# Altium footprint library adafruit.PCBLIB: 643 footprints (part 41 of 41)
Each footprint in its own frame and in the unit in brackets; x right, y up, seen from the top. Pads: shape width x height; smd on the part's side, far side on the other; paste and mask are expansions set on the pad; w line width, h text height; cw(c..) or ccw(c..) is an arc to the next point about the centre after c.
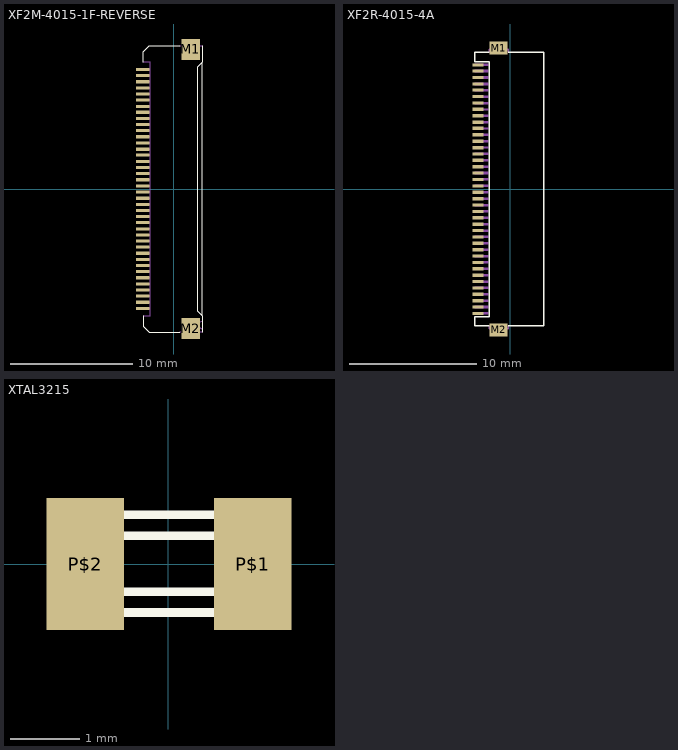
[diagram p40: the footprints below, top view; thin cyan lines are the x and y axes]

## XF2M-4015-1F-REVERSE [mil]
pads (42):
  rect 44x10 smd: 1(-100,384) 2(-100,365) 3(-100,345) 4(-100,325) 5(-100,306) 6(-100,286) 7(-100,266) 8(-100,247) 9(-100,227) 10(-100,207) 11(-100,188) 12(-100,168) 13(-100,148) 14(-100,128) 15(-100,109) 16(-100,89) 17(-100,69) 18(-100,50) 19(-100,30) 20(-100,10) 21(-100,-9.84) 22(-100,-29.53) 23(-100,-49.21) 24(-100,-68.9) 25(-100,-88.58) 26(-100,-108.27) 27(-100,-127.95) 28(-100,-147.64) 29(-100,-167.32) 30(-100,-187.01) 31(-100,-206.69) 32(-100,-226.38) 33(-100,-246.06) 34(-100,-265.75) 35(-100,-285.43) 36(-100,-305.12) 37(-100,-324.8) 38(-100,-344.49) 39(-100,-364.17) 40(-100,-383.86)
  rect 60x67 smd: M1(54,449) M2(54,-448.82)
Top Overlay:
  lines w4: -98.03,-407.48 -98.03,-440.94 -78.35,-460.63 19,-460.63 ; -98.03,408 -98.03,441 -78.35,461 19,461 ; 91,-460.63 91,-407.48 ; 91,461 91,408 ; 91,-407.48 76,-391.73 76,392 91,408 ; 91,-407.48 91,408
Mechanical 16:
  region: -77.36,-380.91 -111.81,-380.91 -111.81,-386.81 -77.36,-386.81
  region: -77.36,-361.22 -111.81,-361.22 -111.81,-367.13 -77.36,-367.13
  region: -77.36,-341.54 -111.81,-341.54 -111.81,-347.44 -77.36,-347.44
  region: -77.36,-321.85 -111.81,-321.85 -111.81,-327.76 -77.36,-327.76
  region: -77.36,-302.17 -111.81,-302.17 -111.81,-308.07 -77.36,-308.07
  region: -77.36,-282.48 -111.81,-282.48 -111.81,-288.39 -77.36,-288.39
  region: -77.36,-262.8 -111.81,-262.8 -111.81,-268.7 -77.36,-268.7
  region: -77.36,-243.11 -111.81,-243.11 -111.81,-249.02 -77.36,-249.02
  region: -77.36,-223.43 -111.81,-223.43 -111.81,-229.33 -77.36,-229.33
  region: -77.36,-203.74 -111.81,-203.74 -111.81,-209.65 -77.36,-209.65
  region: -77.36,-184.06 -111.81,-184.06 -111.81,-189.96 -77.36,-189.96
  region: -77.36,-164.37 -111.81,-164.37 -111.81,-170.28 -77.36,-170.28
  region: -77.36,-144.69 -111.81,-144.69 -111.81,-150.59 -77.36,-150.59
  region: -77.36,-125 -111.81,-125 -111.81,-130.91 -77.36,-130.91
  region: -77.36,-105.31 -111.81,-105.31 -111.81,-111.22 -77.36,-111.22
  region: -77.36,-85.63 -111.81,-85.63 -111.81,-91.54 -77.36,-91.54
  region: -77.36,-65.94 -111.81,-65.94 -111.81,-71.85 -77.36,-71.85
  region: -77.36,-46.26 -111.81,-46.26 -111.81,-52.17 -77.36,-52.17
  region: -77.36,-26.57 -111.81,-26.57 -111.81,-32.48 -77.36,-32.48
  region: -77.36,-6.89 -111.81,-6.89 -111.81,-12.8 -77.36,-12.8
  region: -77.36,13 -111.81,13 -111.81,7 -77.36,7
  region: -77.36,33 -111.81,33 -111.81,27 -77.36,27
  region: -77.36,53 -111.81,53 -111.81,47 -77.36,47
  region: -77.36,72 -111.81,72 -111.81,66 -77.36,66
  region: -77.36,92 -111.81,92 -111.81,86 -77.36,86
  region: -77.36,112 -111.81,112 -111.81,106 -77.36,106
  region: -77.36,131 -111.81,131 -111.81,125 -77.36,125
  region: -77.36,151 -111.81,151 -111.81,145 -77.36,145
  region: -77.36,171 -111.81,171 -111.81,165 -77.36,165
  region: -77.36,190 -111.81,190 -111.81,185 -77.36,185
  region: -77.36,210 -111.81,210 -111.81,204 -77.36,204
  region: -77.36,230 -111.81,230 -111.81,224 -77.36,224
  region: -77.36,250 -111.81,250 -111.81,244 -77.36,244
  region: -77.36,269 -111.81,269 -111.81,263 -77.36,263
  region: -77.36,289 -111.81,289 -111.81,283 -77.36,283
  region: -77.36,309 -111.81,309 -111.81,303 -77.36,303
  region: -77.36,328 -111.81,328 -111.81,322 -77.36,322
  region: -77.36,348 -111.81,348 -111.81,342 -77.36,342
  region: -77.36,368 -111.81,368 -111.81,362 -77.36,362
  region: -77.36,387 -111.81,387 -111.81,381 -77.36,381
  lines w4: -98.03,-407.48 -75.39,-407.48 -75.39,408 -98.03,408 ; 19,-460.63 36,-460.63 36,-472.44 76,-472.44 76,-460.63 91,-460.63 ; 19,461 36,461 36,473 76,473 76,461 91,461 ; 91,-450.79 68,-437.01 91,-423.23

## XF2R-4015-4A [mil]
pads (42):
  rect 34x10 smd: 1(-100,384) 2(-100,365) 3(-100,345) 4(-100,325) 5(-100,306) 6(-100,286) 7(-100,266) 8(-100,247) 9(-100,227) 10(-100,207) 11(-100,188) 12(-100,168) 13(-100,148) 14(-100,128) 15(-100,109) 16(-100,89) 17(-100,69) 18(-100,50) 19(-100,30) 20(-100,10) 21(-100,-9.84) 22(-100,-29.53) 23(-100,-49.21) 24(-100,-68.9) 25(-100,-88.58) 26(-100,-108.27) 27(-100,-127.95) 28(-100,-147.64) 29(-100,-167.32) 30(-100,-187.01) 31(-100,-206.69) 32(-100,-226.38) 33(-100,-246.06) 34(-100,-265.75) 35(-100,-285.43) 36(-100,-305.12) 37(-100,-324.8) 38(-100,-344.49) 39(-100,-364.17) 40(-100,-383.86)
  rect 56x40 smd: M1(-36.02,436) M2(-36.02,-435.04)
Top Overlay:
  lines w4: -65.55,-422.24 -108.86,-422.24 -108.86,-393.7 -65.55,-393.7 -65.55,394 -108.86,394 -108.86,423 -65.55,423 ; -6.5,-422.24 104,-422.24 104,423 -6.5,423
Top Solder:
  rectangle: -117.72,378 -82.28,390
  rectangle: -117.72,359 -82.28,371
  rectangle: -117.72,339 -82.28,351
  rectangle: -117.72,319 -82.28,331
  rectangle: -117.72,300 -82.28,312
  rectangle: -117.72,280 -82.28,292
  rectangle: -117.72,260 -82.28,272
  rectangle: -117.72,241 -82.28,252
  rectangle: -117.72,221 -82.28,233
  rectangle: -117.72,201 -82.28,213
  rectangle: -117.72,182 -82.28,193
  rectangle: -117.72,162 -82.28,174
  rectangle: -117.72,142 -82.28,154
  rectangle: -117.72,123 -82.28,134
  rectangle: -117.72,103 -82.28,115
  rectangle: -117.72,83 -82.28,95
  rectangle: -117.72,63 -82.28,75
  rectangle: -117.72,44 -82.28,56
  rectangle: -117.72,24 -82.28,36
  rectangle: -117.72,4 -82.28,16
  rectangle: -117.72,-15.75 -82.28,-3.94
  rectangle: -117.72,-35.43 -82.28,-23.62
  rectangle: -117.72,-55.12 -82.28,-43.31
  rectangle: -117.72,-74.8 -82.28,-62.99
  rectangle: -117.72,-94.49 -82.28,-82.68
  rectangle: -117.72,-114.17 -82.28,-102.36
  rectangle: -117.72,-133.86 -82.28,-122.05
  rectangle: -117.72,-153.54 -82.28,-141.73
  rectangle: -117.72,-173.23 -82.28,-161.42
  rectangle: -117.72,-192.91 -82.28,-181.1
  rectangle: -117.72,-212.6 -82.28,-200.79
  rectangle: -117.72,-232.28 -82.28,-220.47
  rectangle: -117.72,-251.97 -82.28,-240.16
  rectangle: -117.72,-271.65 -82.28,-259.84
  rectangle: -117.72,-291.34 -82.28,-279.53
  rectangle: -117.72,-311.02 -82.28,-299.21
  rectangle: -117.72,-330.71 -82.28,-318.9
  rectangle: -117.72,-350.39 -82.28,-338.58
  rectangle: -117.72,-370.08 -82.28,-358.27
  rectangle: -117.72,-389.76 -82.28,-377.95
Mechanical 16:
  rectangle: -110.83,380 -67.52,388
  rectangle: -110.83,361 -67.52,369
  rectangle: -110.83,341 -67.52,349
  rectangle: -110.83,321 -67.52,329
  rectangle: -110.83,302 -67.52,310
  rectangle: -110.83,282 -67.52,290
  rectangle: -110.83,262 -67.52,270
  rectangle: -110.83,243 -67.52,250
  rectangle: -110.83,223 -67.52,231
  rectangle: -110.83,203 -67.52,211
  rectangle: -110.83,184 -67.52,191
  rectangle: -110.83,164 -67.52,172
  rectangle: -110.83,144 -67.52,152
  rectangle: -110.83,125 -67.52,132
  rectangle: -110.83,105 -67.52,113
  rectangle: -110.83,85 -67.52,93
  rectangle: -110.83,65 -67.52,73
  rectangle: -110.83,46 -67.52,54
  rectangle: -110.83,26 -67.52,34
  rectangle: -110.83,6 -67.52,14
  rectangle: -110.83,-13.78 -67.52,-5.91
  rectangle: -110.83,-33.46 -67.52,-25.59
  rectangle: -110.83,-53.15 -67.52,-45.28
  rectangle: -110.83,-72.83 -67.52,-64.96
  rectangle: -110.83,-92.52 -67.52,-84.65
  rectangle: -110.83,-112.2 -67.52,-104.33
  rectangle: -110.83,-131.89 -67.52,-124.02
  rectangle: -110.83,-151.57 -67.52,-143.7
  rectangle: -110.83,-171.26 -67.52,-163.39
  rectangle: -110.83,-190.94 -67.52,-183.07
  rectangle: -110.83,-210.63 -67.52,-202.76
  rectangle: -110.83,-230.31 -67.52,-222.44
  rectangle: -110.83,-250 -67.52,-242.13
  rectangle: -110.83,-269.69 -67.52,-261.81
  rectangle: -110.83,-289.37 -67.52,-281.5
  rectangle: -110.83,-309.06 -67.52,-301.18
  rectangle: -110.83,-328.74 -67.52,-320.87
  rectangle: -110.83,-348.43 -67.52,-340.55
  rectangle: -110.83,-368.11 -67.52,-360.24
  rectangle: -110.83,-387.8 -67.52,-379.92
  lines w4: -65.55,-422.24 -65.55,-431.1 -53.74,-431.1 -53.74,-450.79 -49.8,-450.79 -45.87,-446.85 -26.18,-446.85 -22.24,-450.79 -18.31,-450.79 -18.31,-431.1 -6.5,-431.1 -6.5,-422.24 ; -65.55,423 -65.55,432 -53.74,432 -53.74,451 -49.8,451 -45.87,447 -26.18,447 -22.24,451 -18.31,451 -18.31,432 -6.5,432 -6.5,423
Via Holes:
  region: 24,389 -82.28,389 -82.28,-388.78 24,-388.78

## XTAL3215 [mil]
pads (2):
  rect 44x75 smd: P$1(48,0) P$2(-47.24,0)
Top Overlay:
  lines w5: -62.99,-16.43 ccw(c-51.86,-16.43) -51.86,-27.56 52,-27.56 ccw(c51.93,-16.49) 63,-16.43 63,16 ccw(c51,16) 51,28 -54.19,28 ccw(c-54.09,19.1) -62.99,19 -62.99,-16.43 ; -51.18,-7.87 ccw(c-41.34,-5.91) -39.37,-15.75 40,-15.75 ccw(c40.09,-3.84) 52,-3.94 52,4 ccw(c40,4) 40,16 -43.31,16 ccw(c-41.25,6.07) -51.18,4 -51.18,-7.87